# Altium integrated library Rosenberger FAKRA.IntLib: 102 symbols
Pins are listed as number, name and electrical type; pins without a type are passive.

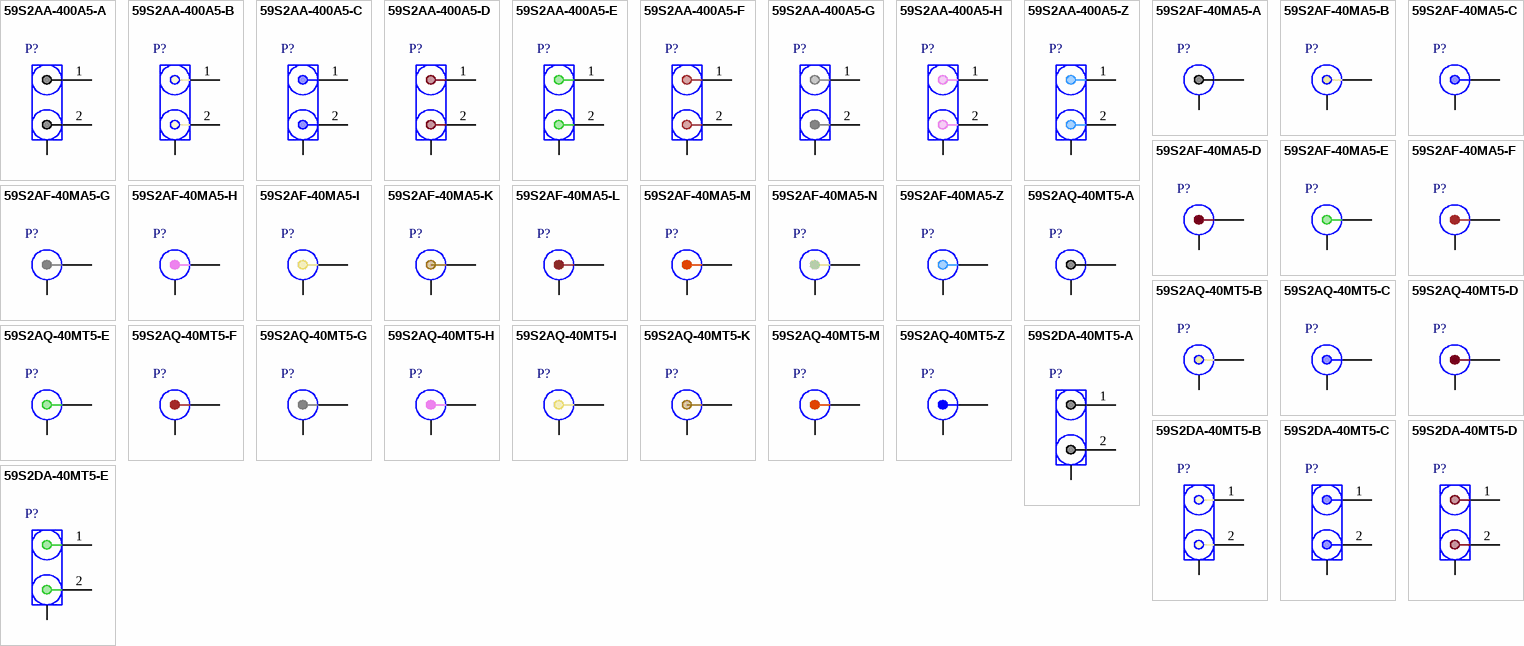
[diagram p0: symbols 59S2AA-400A5-A to 59S2DA-40MT5-E]

## 59S2AA-400A5-A
designator P?
Dual FaKrA Right Angle Plug, Edge Mount, Coding A (Black), Up to 6 GHz, -40 to 105 degC; PartNumber: 59S2AA-400A5-A; Design Note: Footprint in library is a generic example - only application specific footprint delivers High Performance; DatasheetVersion: i00; PackageVersion: i00; PackageReference: 59S2AA-400A5-A; PackageDescription: Dual FaKrA Right Angle Plug, Edge Mount, 21.1 x 17 x 8.35 mm; Coding: A (Black); Mounting Technology: Through Hole; ComponentLink1Description: Manufacturer URL; ComponentLink1URL: http://www.rosenberger.de; ComponentLink2Description: Datasheet; ComponentLink2URL: http://rosenberger.de/ok/images/documents/db/59S2AA-400A5-Y.pdf; ComponentLink3Description: Package Specification; ComponentLink3URL: http://rosenberger.de/ok/images/documents/db/59S2AA-400A5-Y.pdf; ComponentLink4Description: Series Overview / Design Note; ComponentLink4URL: http://rosenberger.de/ok/images/documents/spez/59fakra.pdf; ComponentLink5Description: Webshop / RFQ; ComponentLink5URL: http://www.rosenberger.com/en/contact/sales/
footprint ROS-59S2AA-400A5-A_V (Dual FaKrA Right Angle Plug, Edge Mount, 21.1x17x8.35mm, Rosenberger Recommended)
pins: 1, 2, MH

## 59S2AA-400A5-B
designator P?
Dual FaKrA Right Angle Plug, Edge Mount, Coding B (White), Up to 6 GHz, -40 to 105 degC; PartNumber: 59S2AA-400A5-B; Design Note: Footprint in library is a generic example - only application specific footprint delivers High Performance; DatasheetVersion: i00; PackageVersion: i00; PackageReference: 59S2AA-400A5-B; PackageDescription: Dual FaKrA Right Angle Plug, Edge Mount, 21.1 x 17 x 8.35 mm; Coding: B (White); Mounting Technology: Through Hole; ComponentLink1Description: Manufacturer URL; ComponentLink1URL: http://www.rosenberger.de; ComponentLink2Description: Datasheet; ComponentLink2URL: http://rosenberger.de/ok/images/documents/db/59S2AA-400A5-Y.pdf; ComponentLink3Description: Package Specification; ComponentLink3URL: http://rosenberger.de/ok/images/documents/db/59S2AA-400A5-Y.pdf; ComponentLink4Description: Series Overview / Design Note; ComponentLink4URL: http://rosenberger.de/ok/images/documents/spez/59fakra.pdf; ComponentLink5Description: Webshop / RFQ; ComponentLink5URL: http://www.rosenberger.com/en/contact/sales/
footprint ROS-59S2AA-400A5-B_V (Dual FaKrA Right Angle Plug, Edge Mount, 21.1x17x8.35mm, Rosenberger Recommended)
pins: 1, 2, MH

## 59S2AA-400A5-C
designator P?
Dual FaKrA Right Angle Plug, Edge Mount, Coding C (Blue), Up to 6 GHz, -40 to 105 degC; PartNumber: 59S2AA-400A5-C; Design Note: Footprint in library is a generic example - only application specific footprint delivers High Performance; DatasheetVersion: i00; PackageVersion: i00; PackageReference: 59S2AA-400A5-C; PackageDescription: Dual FaKrA Right Angle Plug, Edge Mount, 21.1 x 17 x 8.35 mm; Coding: C (Blue); Mounting Technology: Through Hole; ComponentLink1Description: Manufacturer URL; ComponentLink1URL: http://www.rosenberger.de; ComponentLink2Description: Datasheet; ComponentLink2URL: http://rosenberger.de/ok/images/documents/db/59S2AA-400A5-Y.pdf; ComponentLink3Description: Package Specification; ComponentLink3URL: http://rosenberger.de/ok/images/documents/db/59S2AA-400A5-Y.pdf; ComponentLink4Description: Series Overview / Design Note; ComponentLink4URL: http://rosenberger.de/ok/images/documents/spez/59fakra.pdf; ComponentLink5Description: Webshop / RFQ; ComponentLink5URL: http://www.rosenberger.com/en/contact/sales/
footprint ROS-59S2AA-400A5-C_V (Dual FaKrA Right Angle Plug, Edge Mount, 21.1x17x8.35mm, Rosenberger Recommended)
pins: 1, 2, MH

## 59S2AA-400A5-D
designator P?
Dual FaKrA Right Angle Plug, Edge Mount, Coding D (Bordeauxviolet), Up to 6 GHz, -40 to 105 degC; PartNumber: 59S2AA-400A5-D; Design Note: Footprint in library is a generic example - only application specific footprint delivers High Performance; DatasheetVersion: i00; PackageVersion: i00; PackageReference: 59S2AA-400A5-D; PackageDescription: Dual FaKrA Right Angle Plug, Edge Mount, 21.1 x 17 x 8.35 mm; Coding: D (Bordeauxviolet); Mounting Technology: Through Hole; ComponentLink1Description: Manufacturer URL; ComponentLink1URL: http://www.rosenberger.de; ComponentLink2Description: Datasheet; ComponentLink2URL: http://rosenberger.de/ok/images/documents/db/59S2AA-400A5-Y.pdf; ComponentLink3Description: Package Specification; ComponentLink3URL: http://rosenberger.de/ok/images/documents/db/59S2AA-400A5-Y.pdf; ComponentLink4Description: Series Overview / Design Note; ComponentLink4URL: http://rosenberger.de/ok/images/documents/spez/59fakra.pdf; ComponentLink5Description: Webshop / RFQ; ComponentLink5URL: http://www.rosenberger.com/en/contact/sales/
footprint ROS-59S2AA-400A5-D_V (Dual FaKrA Right Angle Plug, Edge Mount, 21.1x17x8.35mm, Rosenberger Recommended)
pins: 1, 2, MH

## 59S2AA-400A5-E
designator P?
Dual FaKrA Right Angle Plug, Edge Mount, Coding E (Green), Up to 6 GHz, -40 to 105 degC; PartNumber: 59S2AA-400A5-E; Design Note: Footprint in library is a generic example - only application specific footprint delivers High Performance; DatasheetVersion: i00; PackageVersion: i00; PackageReference: 59S2AA-400A5-E; PackageDescription: Dual FaKrA Right Angle Plug, Edge Mount, 21.1 x 17 x 8.35 mm; Coding: E (Green); Mounting Technology: Through Hole; ComponentLink1Description: Manufacturer URL; ComponentLink1URL: http://www.rosenberger.de; ComponentLink2Description: Datasheet; ComponentLink2URL: http://rosenberger.de/ok/images/documents/db/59S2AA-400A5-Y.pdf; ComponentLink3Description: Package Specification; ComponentLink3URL: http://rosenberger.de/ok/images/documents/db/59S2AA-400A5-Y.pdf; ComponentLink4Description: Series Overview / Design Note; ComponentLink4URL: http://rosenberger.de/ok/images/documents/spez/59fakra.pdf; ComponentLink5Description: Webshop / RFQ; ComponentLink5URL: http://www.rosenberger.com/en/contact/sales/
footprint ROS-59S2AA-400A5-E_V (Dual FaKrA Right Angle Plug, Edge Mount, 21.1x17x8.35mm, Rosenberger Recommended)
pins: 1, 2, MH

## 59S2AA-400A5-F
designator P?
Dual FaKrA Right Angle Plug, Edge Mount, Coding F (Brown), Up to 6 GHz, -40 to 105 degC; PartNumber: 59S2AA-400A5-F; Design Note: Footprint in library is a generic example - only application specific footprint delivers High Performance; DatasheetVersion: i00; PackageVersion: i00; PackageReference: 59S2AA-400A5-F; PackageDescription: Dual FaKrA Right Angle Plug, Edge Mount, 21.1 x 17 x 8.35 mm; Coding: F (Brown); Mounting Technology: Through Hole; ComponentLink1Description: Manufacturer URL; ComponentLink1URL: http://www.rosenberger.de; ComponentLink2Description: Datasheet; ComponentLink2URL: http://rosenberger.de/ok/images/documents/db/59S2AA-400A5-Y.pdf; ComponentLink3Description: Package Specification; ComponentLink3URL: http://rosenberger.de/ok/images/documents/db/59S2AA-400A5-Y.pdf; ComponentLink4Description: Series Overview / Design Note; ComponentLink4URL: http://rosenberger.de/ok/images/documents/spez/59fakra.pdf; ComponentLink5Description: Webshop / RFQ; ComponentLink5URL: http://www.rosenberger.com/en/contact/sales/
footprint ROS-59S2AA-400A5-F_V (Dual FaKrA Right Angle Plug, Edge Mount, 21.1x17x8.35mm, Rosenberger Recommended)
pins: 1, 2, MH

## 59S2AA-400A5-G
designator P?
Dual FaKrA Right Angle Plug, Edge Mount, Coding G (Grey), Up to 6 GHz, -40 to 105 degC; PartNumber: 59S2AA-400A5-G; Design Note: Footprint in library is a generic example - only application specific footprint delivers High Performance; DatasheetVersion: i00; PackageVersion: i00; PackageReference: 59S2AA-400A5-G; PackageDescription: Dual FaKrA Right Angle Plug, Edge Mount, 21.1 x 17 x 8.35 mm; Coding: G (Grey); Mounting Technology: Through Hole; ComponentLink1Description: Manufacturer URL; ComponentLink1URL: http://www.rosenberger.de; ComponentLink2Description: Datasheet; ComponentLink2URL: http://rosenberger.de/ok/images/documents/db/59S2AA-400A5-Y.pdf; ComponentLink3Description: Package Specification; ComponentLink3URL: http://rosenberger.de/ok/images/documents/db/59S2AA-400A5-Y.pdf; ComponentLink4Description: Series Overview / Design Note; ComponentLink4URL: http://rosenberger.de/ok/images/documents/spez/59fakra.pdf; ComponentLink5Description: Webshop / RFQ; ComponentLink5URL: http://www.rosenberger.com/en/contact/sales/
footprint ROS-59S2AA-400A5-G_V (Dual FaKrA Right Angle Plug, Edge Mount, 21.1x17x8.35mm, Rosenberger Recommended)
pins: 1, 2, MH

## 59S2AA-400A5-H
designator P?
Dual FaKrA Right Angle Plug, Edge Mount, Coding H (Violet), Up to 6 GHz, -40 to 105 degC; PartNumber: 59S2AA-400A5-H; Design Note: Footprint in library is a generic example - only application specific footprint delivers High Performance; DatasheetVersion: i00; PackageVersion: i00; PackageReference: 59S2AA-400A5-H; PackageDescription: Dual FaKrA Right Angle Plug, Edge Mount, 21.1 x 17 x 8.35 mm; Coding: H (Violet); Mounting Technology: Through Hole; ComponentLink1Description: Manufacturer URL; ComponentLink1URL: http://www.rosenberger.de; ComponentLink2Description: Datasheet; ComponentLink2URL: http://rosenberger.de/ok/images/documents/db/59S2AA-400A5-Y.pdf; ComponentLink3Description: Package Specification; ComponentLink3URL: http://rosenberger.de/ok/images/documents/db/59S2AA-400A5-Y.pdf; ComponentLink4Description: Series Overview / Design Note; ComponentLink4URL: http://rosenberger.de/ok/images/documents/spez/59fakra.pdf; ComponentLink5Description: Webshop / RFQ; ComponentLink5URL: http://www.rosenberger.com/en/contact/sales/
footprint ROS-59S2AA-400A5-H_V (Dual FaKrA Right Angle Plug, Edge Mount, 21.1x17x8.35mm, Rosenberger Recommended)
pins: 1, 2, MH

## 59S2AA-400A5-Z
designator P?
Dual FaKrA Right Angle Plug, Edge Mount, Coding Z (Waterblue), Up to 6 GHz, -40 to 105 degC; PartNumber: 59S2AA-400A5-Z; Design Note: Footprint in library is a generic example - only application specific footprint delivers High Performance; DatasheetVersion: i00; PackageVersion: i00; PackageReference: 59S2AA-400A5-Z; PackageDescription: Dual FaKrA Right Angle Plug, Edge Mount, 21.1 x 17 x 8.35 mm; Coding: Z (Waterblue); Mounting Technology: Through Hole; ComponentLink1Description: Manufacturer URL; ComponentLink1URL: http://www.rosenberger.de; ComponentLink2Description: Datasheet; ComponentLink2URL: http://rosenberger.de/ok/images/documents/db/59S2AA-400A5-Y.pdf; ComponentLink3Description: Package Specification; ComponentLink3URL: http://rosenberger.de/ok/images/documents/db/59S2AA-400A5-Y.pdf; ComponentLink4Description: Series Overview / Design Note; ComponentLink4URL: http://rosenberger.de/ok/images/documents/spez/59fakra.pdf; ComponentLink5Description: Webshop / RFQ; ComponentLink5URL: http://www.rosenberger.com/en/contact/sales/
footprint ROS-59S2AA-400A5-Z_V (Dual FaKrA Right Angle Plug, Edge Mount, 21.1x17x8.35mm, Rosenberger Recommended)
pins: 1, 2, MH

## 59S2AF-40MA5-A
designator P?
FaKrA Right Angle Plug, Edge Mount Pin in Paste, Coding A (Black), Up to 6 GHz, -40 to 105 degC; PartNumber: 59S2AF-40MA5-A; Design Note: Footprint in library is a generic example - only application specific footprint delivers High Performance; DatasheetVersion: b00; PackageVersion: b00; PackageReference: 59S2AF-40MA5-A; PackageDescription: FaKra-HF Right Angle Plug, Edge Mount Pin in Paste, 23.1 x 9.3 x 5.45 mm; Coding: A (Black); Mounting Technology: Pin-in-Paste; ComponentLink1Description: Manufacturer URL; ComponentLink1URL: http://www.rosenberger.de; ComponentLink2Description: Datasheet; ComponentLink2URL: http://rosenberger.de/ok/images/documents/db/59S2AF-40MA5-Y.pdf; ComponentLink3Description: Package Specification; ComponentLink3URL: http://rosenberger.de/ok/images/documents/db/59S2AF-40MA5-Y.pdf; ComponentLink4Description: Series Overview / Design Note; ComponentLink4URL: http://rosenberger.de/ok/images/documents/spez/59fakra.pdf; ComponentLink5Description: Webshop / RFQ; ComponentLink5URL: http://www.rosenberger.com/en/contact/sales/
footprint ROS-59S2AF-40MA5-A_V (FaKra-HF Right Angle Plug, Edge Mount Pin in Paste, 23.1x9.3x5.45mm, Rosenberger Recommended)
pins: 1, MH

## 59S2AF-40MA5-B
designator P?
FaKrA Right Angle Plug, Edge Mount Pin in Paste, Coding B (White), Up to 6 GHz, -40 to 105 degC; PartNumber: 59S2AF-40MA5-B; Design Note: Footprint in library is a generic example - only application specific footprint delivers High Performance; DatasheetVersion: b00; PackageVersion: b00; PackageReference: 59S2AF-40MA5-B; PackageDescription: FaKra-HF Right Angle Plug, Edge Mount Pin in Paste, 23.1 x 9.3 x 5.45 mm; Coding: B (White); Mounting Technology: Pin-in-Paste; ComponentLink1Description: Manufacturer URL; ComponentLink1URL: http://www.rosenberger.de; ComponentLink2Description: Datasheet; ComponentLink2URL: http://rosenberger.de/ok/images/documents/db/59S2AF-40MA5-Y.pdf; ComponentLink3Description: Package Specification; ComponentLink3URL: http://rosenberger.de/ok/images/documents/db/59S2AF-40MA5-Y.pdf; ComponentLink4Description: Series Overview / Design Note; ComponentLink4URL: http://rosenberger.de/ok/images/documents/spez/59fakra.pdf; ComponentLink5Description: Webshop / RFQ; ComponentLink5URL: http://www.rosenberger.com/en/contact/sales/
footprint ROS-59S2AF-40MA5-B_V (FaKra-HF Right Angle Plug, Edge Mount Pin in Paste, 23.1x9.3x5.45mm, Rosenberger Recommended)
pins: 1, MH

## 59S2AF-40MA5-C
designator P?
FaKrA Right Angle Plug, Edge Mount Pin in Paste, Coding C (Blue), Up to 6 GHz, -40 to 105 degC; PartNumber: 59S2AF-40MA5-C; Design Note: Footprint in library is a generic example - only application specific footprint delivers High Performance; DatasheetVersion: b00; PackageVersion: b00; PackageReference: 59S2AF-40MA5-C; PackageDescription: FaKra-HF Right Angle Plug, Edge Mount Pin in Paste, 23.1 x 9.3 x 5.45 mm; Coding: C (Blue); Mounting Technology: Pin-in-Paste; ComponentLink1Description: Manufacturer URL; ComponentLink1URL: http://www.rosenberger.de; ComponentLink2Description: Datasheet; ComponentLink2URL: http://rosenberger.de/ok/images/documents/db/59S2AF-40MA5-Y.pdf; ComponentLink3Description: Package Specification; ComponentLink3URL: http://rosenberger.de/ok/images/documents/db/59S2AF-40MA5-Y.pdf; ComponentLink4Description: Series Overview / Design Note; ComponentLink4URL: http://rosenberger.de/ok/images/documents/spez/59fakra.pdf; ComponentLink5Description: Webshop / RFQ; ComponentLink5URL: http://www.rosenberger.com/en/contact/sales/
footprint ROS-59S2AF-40MA5-C_V (FaKra-HF Right Angle Plug, Edge Mount Pin in Paste, 23.1x9.3x5.45mm, Rosenberger Recommended)
pins: 1, MH

## 59S2AF-40MA5-D
designator P?
FaKrA Right Angle Plug, Edge Mount Pin in Paste, Coding D (Bordeauxviolet), Up to 6 GHz, -40 to 105 degC; PartNumber: 59S2AF-40MA5-D; Design Note: Footprint in library is a generic example - only application specific footprint delivers High Performance; DatasheetVersion: b00; PackageVersion: b00; PackageReference: 59S2AF-40MA5-D; PackageDescription: FaKra-HF Right Angle Plug, Edge Mount Pin in Paste, 23.1 x 9.3 x 5.45 mm; Coding: D (Bordeauxviolet); Mounting Technology: Pin-in-Paste; ComponentLink1Description: Manufacturer URL; ComponentLink1URL: http://www.rosenberger.de; ComponentLink2Description: Datasheet; ComponentLink2URL: http://rosenberger.de/ok/images/documents/db/59S2AF-40MA5-Y.pdf; ComponentLink3Description: Package Specification; ComponentLink3URL: http://rosenberger.de/ok/images/documents/db/59S2AF-40MA5-Y.pdf; ComponentLink4Description: Series Overview / Design Note; ComponentLink4URL: http://rosenberger.de/ok/images/documents/spez/59fakra.pdf; ComponentLink5Description: Webshop / RFQ; ComponentLink5URL: http://www.rosenberger.com/en/contact/sales/
footprint ROS-59S2AF-40MA5-D_V (FaKra-HF Right Angle Plug, Edge Mount Pin in Paste, 23.1x9.3x5.45mm, Rosenberger Recommended)
pins: 1, MH

## 59S2AF-40MA5-E
designator P?
FaKrA Right Angle Plug, Edge Mount Pin in Paste, Coding E (Green), Up to 6 GHz, -40 to 105 degC; PartNumber: 59S2AF-40MA5-E; Design Note: Footprint in library is a generic example - only application specific footprint delivers High Performance; DatasheetVersion: b00; PackageVersion: b00; PackageReference: 59S2AF-40MA5-E; PackageDescription: FaKra-HF Right Angle Plug, Edge Mount Pin in Paste, 23.1 x 9.3 x 5.45 mm; Coding: E (Green); Mounting Technology: Pin-in-Paste; ComponentLink1Description: Manufacturer URL; ComponentLink1URL: http://www.rosenberger.de; ComponentLink2Description: Datasheet; ComponentLink2URL: http://rosenberger.de/ok/images/documents/db/59S2AF-40MA5-Y.pdf; ComponentLink3Description: Package Specification; ComponentLink3URL: http://rosenberger.de/ok/images/documents/db/59S2AF-40MA5-Y.pdf; ComponentLink4Description: Series Overview / Design Note; ComponentLink4URL: http://rosenberger.de/ok/images/documents/spez/59fakra.pdf; ComponentLink5Description: Webshop / RFQ; ComponentLink5URL: http://www.rosenberger.com/en/contact/sales/
footprint ROS-59S2AF-40MA5-E_V (FaKra-HF Right Angle Plug, Edge Mount Pin in Paste, 23.1x9.3x5.45mm, Rosenberger Recommended)
pins: 1, MH

## 59S2AF-40MA5-F
designator P?
FaKrA Right Angle Plug, Edge Mount Pin in Paste, Coding F (Brown), Up to 6 GHz, -40 to 105 degC; PartNumber: 59S2AF-40MA5-F; Design Note: Footprint in library is a generic example - only application specific footprint delivers High Performance; DatasheetVersion: b00; PackageVersion: b00; PackageReference: 59S2AF-40MA5-F; PackageDescription: FaKra-HF Right Angle Plug, Edge Mount Pin in Paste, 23.1 x 9.3 x 5.45 mm; Coding: F (Brown); Mounting Technology: Pin-in-Paste; ComponentLink1Description: Manufacturer URL; ComponentLink1URL: http://www.rosenberger.de; ComponentLink2Description: Datasheet; ComponentLink2URL: http://rosenberger.de/ok/images/documents/db/59S2AF-40MA5-Y.pdf; ComponentLink3Description: Package Specification; ComponentLink3URL: http://rosenberger.de/ok/images/documents/db/59S2AF-40MA5-Y.pdf; ComponentLink4Description: Series Overview / Design Note; ComponentLink4URL: http://rosenberger.de/ok/images/documents/spez/59fakra.pdf; ComponentLink5Description: Webshop / RFQ; ComponentLink5URL: http://www.rosenberger.com/en/contact/sales/
footprint ROS-59S2AF-40MA5-F_V (FaKra-HF Right Angle Plug, Edge Mount Pin in Paste, 23.1x9.3x5.45mm, Rosenberger Recommended)
pins: 1, MH

## 59S2AF-40MA5-G
designator P?
FaKrA Right Angle Plug, Edge Mount Pin in Paste, Coding G (Grey), Up to 6 GHz, -40 to 105 degC; PartNumber: 59S2AF-40MA5-G; Design Note: Footprint in library is a generic example - only application specific footprint delivers High Performance; DatasheetVersion: b00; PackageVersion: b00; PackageReference: 59S2AF-40MA5-G; PackageDescription: FaKra-HF Right Angle Plug, Edge Mount Pin in Paste, 23.1 x 9.3 x 5.45 mm; Coding: G (Grey); Mounting Technology: Pin-in-Paste; ComponentLink1Description: Manufacturer URL; ComponentLink1URL: http://www.rosenberger.de; ComponentLink2Description: Datasheet; ComponentLink2URL: http://rosenberger.de/ok/images/documents/db/59S2AF-40MA5-Y.pdf; ComponentLink3Description: Package Specification; ComponentLink3URL: http://rosenberger.de/ok/images/documents/db/59S2AF-40MA5-Y.pdf; ComponentLink4Description: Series Overview / Design Note; ComponentLink4URL: http://rosenberger.de/ok/images/documents/spez/59fakra.pdf; ComponentLink5Description: Webshop / RFQ; ComponentLink5URL: http://www.rosenberger.com/en/contact/sales/
footprint ROS-59S2AF-40MA5-G_V (FaKra-HF Right Angle Plug, Edge Mount Pin in Paste, 23.1x9.3x5.45mm, Rosenberger Recommended)
pins: 1, MH

## 59S2AF-40MA5-H
designator P?
FaKrA Right Angle Plug, Edge Mount Pin in Paste, Coding H (Violet), Up to 6 GHz, -40 to 105 degC; PartNumber: 59S2AF-40MA5-H; Design Note: Footprint in library is a generic example - only application specific footprint delivers High Performance; DatasheetVersion: b00; PackageVersion: b00; PackageReference: 59S2AF-40MA5-H; PackageDescription: FaKra-HF Right Angle Plug, Edge Mount Pin in Paste, 23.1 x 9.3 x 5.45 mm; Coding: H (Violet); Mounting Technology: Pin-in-Paste; ComponentLink1Description: Manufacturer URL; ComponentLink1URL: http://www.rosenberger.de; ComponentLink2Description: Datasheet; ComponentLink2URL: http://rosenberger.de/ok/images/documents/db/59S2AF-40MA5-Y.pdf; ComponentLink3Description: Package Specification; ComponentLink3URL: http://rosenberger.de/ok/images/documents/db/59S2AF-40MA5-Y.pdf; ComponentLink4Description: Series Overview / Design Note; ComponentLink4URL: http://rosenberger.de/ok/images/documents/spez/59fakra.pdf; ComponentLink5Description: Webshop / RFQ; ComponentLink5URL: http://www.rosenberger.com/en/contact/sales/
footprint ROS-59S2AF-40MA5-H_V (FaKra-HF Right Angle Plug, Edge Mount Pin in Paste, 23.1x9.3x5.45mm, Rosenberger Recommended)
pins: 1, MH

## 59S2AF-40MA5-I
designator P?
FaKrA Right Angle Plug, Edge Mount Pin in Paste, Coding I (Beige), Up to 6 GHz, -40 to 105 degC; PartNumber: 59S2AF-40MA5-I; Design Note: Footprint in library is a generic example - only application specific footprint delivers High Performance; DatasheetVersion: b00; PackageVersion: b00; PackageReference: 59S2AF-40MA5-I; PackageDescription: FaKra-HF Right Angle Plug, Edge Mount Pin in Paste, 23.1 x 9.3 x 5.45 mm; Coding: I (Beige); Mounting Technology: Pin-in-Paste; ComponentLink1Description: Manufacturer URL; ComponentLink1URL: http://www.rosenberger.de; ComponentLink2Description: Datasheet; ComponentLink2URL: http://rosenberger.de/ok/images/documents/db/59S2AF-40MA5-Y.pdf; ComponentLink3Description: Package Specification; ComponentLink3URL: http://rosenberger.de/ok/images/documents/db/59S2AF-40MA5-Y.pdf; ComponentLink4Description: Series Overview / Design Note; ComponentLink4URL: http://rosenberger.de/ok/images/documents/spez/59fakra.pdf; ComponentLink5Description: Webshop / RFQ; ComponentLink5URL: http://www.rosenberger.com/en/contact/sales/
footprint ROS-59S2AF-40MA5-I_V (FaKra-HF Right Angle Plug, Edge Mount Pin in Paste, 23.1x9.3x5.45mm, Rosenberger Recommended)
pins: 1, MH

## 59S2AF-40MA5-K
designator P?
FaKrA Right Angle Plug, Edge Mount Pin in Paste, Coding K (Curry), Up to 6 GHz, -40 to 105 degC; PartNumber: 59S2AF-40MA5-K; Design Note: Footprint in library is a generic example - only application specific footprint delivers High Performance; DatasheetVersion: b00; PackageVersion: b00; PackageReference: 59S2AF-40MA5-K; PackageDescription: FaKra-HF Right Angle Plug, Edge Mount Pin in Paste, 23.1 x 9.3 x 5.45 mm; Coding: K (Curry); Mounting Technology: Pin-in-Paste; ComponentLink1Description: Manufacturer URL; ComponentLink1URL: http://www.rosenberger.de; ComponentLink2Description: Datasheet; ComponentLink2URL: http://rosenberger.de/ok/images/documents/db/59S2AF-40MA5-Y.pdf; ComponentLink3Description: Package Specification; ComponentLink3URL: http://rosenberger.de/ok/images/documents/db/59S2AF-40MA5-Y.pdf; ComponentLink4Description: Series Overview / Design Note; ComponentLink4URL: http://rosenberger.de/ok/images/documents/spez/59fakra.pdf; ComponentLink5Description: Webshop / RFQ; ComponentLink5URL: http://www.rosenberger.com/en/contact/sales/
footprint ROS-59S2AF-40MA5-K_V (FaKra-HF Right Angle Plug, Edge Mount Pin in Paste, 23.1x9.3x5.45mm, Rosenberger Recommended)
pins: 1, MH

## 59S2AF-40MA5-L
designator P?
FaKrA Right Angle Plug, Edge Mount Pin in Paste, Coding L (Carmine-Red), Up to 6 GHz, -40 to 105 degC; PartNumber: 59S2AF-40MA5-L; Design Note: Footprint in library is a generic example - only application specific footprint delivers High Performance; DatasheetVersion: b00; PackageVersion: b00; PackageReference: 59S2AF-40MA5-L; PackageDescription: FaKra-HF Right Angle Plug, Edge Mount Pin in Paste, 23.1 x 9.3 x 5.45 mm; Coding: L (Carmine-Red); Mounting Technology: Pin-in-Paste; ComponentLink1Description: Manufacturer URL; ComponentLink1URL: http://www.rosenberger.de; ComponentLink2Description: Datasheet; ComponentLink2URL: http://rosenberger.de/ok/images/documents/db/59S2AF-40MA5-Y.pdf; ComponentLink3Description: Package Specification; ComponentLink3URL: http://rosenberger.de/ok/images/documents/db/59S2AF-40MA5-Y.pdf; ComponentLink4Description: Series Overview / Design Note; ComponentLink4URL: http://rosenberger.de/ok/images/documents/spez/59fakra.pdf; ComponentLink5Description: Webshop / RFQ; ComponentLink5URL: http://www.rosenberger.com/en/contact/sales/
footprint ROS-59S2AF-40MA5-L_V (FaKra-HF Right Angle Plug, Edge Mount Pin in Paste, 23.1x9.3x5.45mm, Rosenberger Recommended)
pins: 1, MH

## 59S2AF-40MA5-M
designator P?
FaKrA Right Angle Plug, Edge Mount Pin in Paste, Coding M (Pastel-Orange), Up to 6 GHz, -40 to 105 degC; PartNumber: 59S2AF-40MA5-M; Coding: M (Pastel Orange); Design Note: Footprint in library is a generic example - only application specific footprint delivers High Performance; DatasheetVersion: b00; PackageVersion: b00; PackageReference: 59S2AF-40MA5-M; PackageDescription: FaKra-HF Right Angle Plug, Edge Mount Pin in Paste, 23.1 x 9.3 x 5.45 mm; Mounting Technology: Pin-in-Paste; ComponentLink1Description: Manufacturer URL; ComponentLink1URL: http://www.rosenberger.de; ComponentLink2Description: Datasheet; ComponentLink2URL: http://rosenberger.de/ok/images/documents/db/59S2AF-40MA5-Y.pdf; ComponentLink3Description: Package Specification; ComponentLink3URL: http://rosenberger.de/ok/images/documents/db/59S2AF-40MA5-Y.pdf; ComponentLink4Description: Series Overview / Design Note; ComponentLink4URL: http://rosenberger.de/ok/images/documents/spez/59fakra.pdf; ComponentLink5Description: Webshop / RFQ; ComponentLink5URL: http://www.rosenberger.com/en/contact/sales/
footprint ROS-59S2AF-40MA5-M_V (FaKra-HF Right Angle Plug, Edge Mount Pin in Paste, 23.1x9.3x5.45mm, Rosenberger Recommended)
pins: 1, MH

## 59S2AF-40MA5-N
designator P?
FaKrA Right Angle Plug, Edge Mount Pin in Paste, Coding N (Pastel-Green), Up to 6 GHz, -40 to 105 degC; PartNumber: 59S2AF-40MA5-N; Design Note: Footprint in library is a generic example - only application specific footprint delivers High Performance; DatasheetVersion: b00; PackageVersion: b00; PackageReference: 59S2AF-40MA5-N; PackageDescription: FaKra-HF Right Angle Plug, Edge Mount Pin in Paste, 23.1 x 9.3 x 5.45 mm; Coding: N (Pastel-Green); Mounting Technology: Pin-in-Paste; ComponentLink1Description: Manufacturer URL; ComponentLink1URL: http://www.rosenberger.de; ComponentLink2Description: Datasheet; ComponentLink2URL: http://rosenberger.de/ok/images/documents/db/59S2AF-40MA5-Y.pdf; ComponentLink3Description: Package Specification; ComponentLink3URL: http://rosenberger.de/ok/images/documents/db/59S2AF-40MA5-Y.pdf; ComponentLink4Description: Series Overview / Design Note; ComponentLink4URL: http://rosenberger.de/ok/images/documents/spez/59fakra.pdf; ComponentLink5Description: Webshop / RFQ; ComponentLink5URL: http://www.rosenberger.com/en/contact/sales/
footprint ROS-59S2AF-40MA5-N_V (FaKra-HF Right Angle Plug, Edge Mount Pin in Paste, 23.1x9.3x5.45mm, Rosenberger Recommended)
pins: 1, MH

## 59S2AF-40MA5-Z
designator P?
FaKrA Right Angle Plug, Edge Mount Pin in Paste, Upside Down, Coding Z (Waterblue), Up to 6 GHz, -40 to 105 degC; PartNumber: 59S2AF-40MA5-Z; Design Note: Footprint in library is a generic example - only application specific footprint delivers High Performance; DatasheetVersion: b00; PackageVersion: b00; PackageReference: 59S2AF-40MA5-Z; PackageDescription: FaKra-HF Right Angle Plug, Edge Mount Pin in Paste, 23.1 x 9.3 x 5.45 mm; Coding: Z (Waterblue); Mounting Technology: Pin-in-Paste; ComponentLink1Description: Manufacturer URL; ComponentLink1URL: http://www.rosenberger.de; ComponentLink2Description: Datasheet; ComponentLink2URL: http://rosenberger.de/ok/images/documents/db/59S2AF-40MA5-Y.pdf; ComponentLink3Description: Package Specification; ComponentLink3URL: http://rosenberger.de/ok/images/documents/db/59S2AF-40MA5-Y.pdf; ComponentLink4Description: Series Overview / Design Note; ComponentLink4URL: http://rosenberger.de/ok/images/documents/spez/59fakra.pdf; ComponentLink5Description: Webshop / RFQ; ComponentLink5URL: http://www.rosenberger.com/en/contact/sales/
footprint ROS-59S2AF-40MA5-Z_V (FaKra-HF Right Angle Plug, Edge Mount Pin in Paste, 23.1x9.3x5.45mm, Rosenberger Recommended)
pins: 1, MH

## 59S2AQ-40MT5-A
designator P?
FaKrA Right Angle Plug, Edge Mount Pin in Paste, Coding A (Black), In Line, Up to 6 GHz, -40 to 105 degC; PartNumber: 59S2AQ-40MT5-A; Design Note: Footprint in library is a generic example - only application specific footprint delivers High Performance; DatasheetVersion: c00; PackageVersion: c00; PackageReference: 59S2AQ-40MT5-A; PackageDescription: FaKrA Right Angle Plug, Pin in Paste, 22.65 x 8.5 x 3.8 mm; Coding: A (Black); Mounting Technology: Pin-in-Paste; ComponentLink1Description: Manufacturer URL; ComponentLink1URL: http://www.rosenberger.de; ComponentLink2Description: Datasheet; ComponentLink2URL: http://rosenberger.de/ok/images/documents/db/59S2AQ-40MT5-Y.pdf; ComponentLink3Description: Package Specification; ComponentLink3URL: http://rosenberger.de/ok/images/documents/db/59S2AQ-40MT5-Y.pdf; ComponentLink4Description: Series Overview / Design Note; ComponentLink4URL: http://rosenberger.de/ok/images/documents/spez/59fakra.pdf; ComponentLink5Description: Webshop / RFQ; ComponentLink5URL: http://www.rosenberger.com/en/contact/sales/
footprint ROS-59S2AQ-40MT5-A_V (FaKrA Right Angle Plug, Pin in Paste, 22.65x8.5x3.8mm, Rosenberger Recommended)
pins: 1, MH

## 59S2AQ-40MT5-B
designator P?
FaKrA Right Angle Plug, Edge Mount Pin in Paste, Coding B (White), In Line, Up to 6 GHz, -40 to 105 degC; PartNumber: 59S2AQ-40MT5-B; Design Note: Footprint in library is a generic example - only application specific footprint delivers High Performance; DatasheetVersion: c00; PackageVersion: c00; PackageReference: 59S2AQ-40MT5-B; PackageDescription: FaKrA Right Angle Plug, Pin in Paste, 22.65 x 8.5 x 3.8 mm; Coding: B (White); Mounting Technology: Pin-in-Paste; ComponentLink1Description: Manufacturer URL; ComponentLink1URL: http://www.rosenberger.de; ComponentLink2Description: Datasheet; ComponentLink2URL: http://rosenberger.de/ok/images/documents/db/59S2AQ-40MT5-Y.pdf; ComponentLink3Description: Package Specification; ComponentLink3URL: http://rosenberger.de/ok/images/documents/db/59S2AQ-40MT5-Y.pdf; ComponentLink4Description: Series Overview / Design Note; ComponentLink4URL: http://rosenberger.de/ok/images/documents/spez/59fakra.pdf; ComponentLink5Description: Webshop / RFQ; ComponentLink5URL: http://www.rosenberger.com/en/contact/sales/
footprint ROS-59S2AQ-40MT5-B_V (FaKrA Right Angle Plug, Pin in Paste, 22.65x8.5x3.8mm, Rosenberger Recommended)
pins: 1, MH

## 59S2AQ-40MT5-C
designator P?
FaKrA Right Angle Plug, Edge Mount Pin in Paste, Coding C (Blue), In Line, Up to 6 GHz, -40 to 105 degC; PartNumber: 59S2AQ-40MT5-C; Design Note: Footprint in library is a generic example - only application specific footprint delivers High Performance; DatasheetVersion: c00; PackageVersion: c00; PackageReference: 59S2AQ-40MT5-C; PackageDescription: FaKrA Right Angle Plug, Pin in Paste, 22.65 x 8.5 x 3.8 mm; Coding: C (Blue); Mounting Technology: Pin-in-Paste; ComponentLink1Description: Manufacturer URL; ComponentLink1URL: http://www.rosenberger.de; ComponentLink2Description: Datasheet; ComponentLink2URL: http://rosenberger.de/ok/images/documents/db/59S2AQ-40MT5-Y.pdf; ComponentLink3Description: Package Specification; ComponentLink3URL: http://rosenberger.de/ok/images/documents/db/59S2AQ-40MT5-Y.pdf; ComponentLink4Description: Series Overview / Design Note; ComponentLink4URL: http://rosenberger.de/ok/images/documents/spez/59fakra.pdf; ComponentLink5Description: Webshop / RFQ; ComponentLink5URL: http://www.rosenberger.com/en/contact/sales/
footprint ROS-59S2AQ-40MT5-C_V (FaKrA Right Angle Plug, Pin in Paste, 22.65x8.5x3.8mm, Rosenberger Recommended)
pins: 1, MH

## 59S2AQ-40MT5-D
designator P?
FaKrA Right Angle Plug, Edge Mount Pin in Paste, Coding D (Bordeauxviolet), In Line, Up to 6 GHz, -40 to 105 degC; PartNumber: 59S2AQ-40MT5-D; Design Note: Footprint in library is a generic example - only application specific footprint delivers High Performance; DatasheetVersion: c00; PackageVersion: c00; PackageReference: 59S2AQ-40MT5-D; PackageDescription: FaKrA Right Angle Plug, Pin in Paste, 22.65 x 8.5 x 3.8 mm; Coding: D (Bordeauxviolet); Mounting Technology: Pin-in-Paste; ComponentLink1Description: Manufacturer URL; ComponentLink1URL: http://www.rosenberger.de; ComponentLink2Description: Datasheet; ComponentLink2URL: http://rosenberger.de/ok/images/documents/db/59S2AQ-40MT5-Y.pdf; ComponentLink3Description: Package Specification; ComponentLink3URL: http://rosenberger.de/ok/images/documents/db/59S2AQ-40MT5-Y.pdf; ComponentLink4Description: Series Overview / Design Note; ComponentLink4URL: http://rosenberger.de/ok/images/documents/spez/59fakra.pdf; ComponentLink5Description: Webshop / RFQ; ComponentLink5URL: http://www.rosenberger.com/en/contact/sales/
footprint ROS-59S2AQ-40MT5-D_V (FaKrA Right Angle Plug, Pin in Paste, 22.65x8.5x3.8mm, Rosenberger Recommended)
pins: 1, MH

## 59S2AQ-40MT5-E
designator P?
FaKrA Right Angle Plug, Edge Mount Pin in Paste, Coding E (Green), In Line, Up to 6 GHz, -40 to 105 degC; PartNumber: 59S2AQ-40MT5-E; Design Note: Footprint in library is a generic example - only application specific footprint delivers High Performance; DatasheetVersion: c00; PackageVersion: c00; PackageReference: 59S2AQ-40MT5-E; PackageDescription: FaKrA Right Angle Plug, Pin in Paste, 22.65 x 8.5 x 3.8 mm; Coding: E (Green); Mounting Technology: Pin-in-Paste; ComponentLink1Description: Manufacturer URL; ComponentLink1URL: http://www.rosenberger.de; ComponentLink2Description: Datasheet; ComponentLink2URL: http://rosenberger.de/ok/images/documents/db/59S2AQ-40MT5-Y.pdf; ComponentLink3Description: Package Specification; ComponentLink3URL: http://rosenberger.de/ok/images/documents/db/59S2AQ-40MT5-Y.pdf; ComponentLink4Description: Series Overview / Design Note; ComponentLink4URL: http://rosenberger.de/ok/images/documents/spez/59fakra.pdf; ComponentLink5Description: Webshop / RFQ; ComponentLink5URL: http://www.rosenberger.com/en/contact/sales/
footprint ROS-59S2AQ-40MT5-E_V (FaKrA Right Angle Plug, Pin in Paste, 22.65x8.5x3.8mm, Rosenberger Recommended)
pins: 1, MH

## 59S2AQ-40MT5-F
designator P?
FaKrA Right Angle Plug, Edge Mount Pin in Paste, Coding F (Brown), In Line, Up to 6 GHz, -40 to 105 degC; PartNumber: 59S2AQ-40MT5-F; Design Note: Footprint in library is a generic example - only application specific footprint delivers High Performance; DatasheetVersion: c00; PackageVersion: c00; PackageReference: 59S2AQ-40MT5-F; PackageDescription: FaKrA Right Angle Plug, Pin in Paste, 22.65 x 8.5 x 3.8 mm; Coding: F (Brown); Mounting Technology: Pin-in-Paste; ComponentLink1Description: Manufacturer URL; ComponentLink1URL: http://www.rosenberger.de; ComponentLink2Description: Datasheet; ComponentLink2URL: http://rosenberger.de/ok/images/documents/db/59S2AQ-40MT5-Y.pdf; ComponentLink3Description: Package Specification; ComponentLink3URL: http://rosenberger.de/ok/images/documents/db/59S2AQ-40MT5-Y.pdf; ComponentLink4Description: Series Overview / Design Note; ComponentLink4URL: http://rosenberger.de/ok/images/documents/spez/59fakra.pdf; ComponentLink5Description: Webshop / RFQ; ComponentLink5URL: http://www.rosenberger.com/en/contact/sales/
footprint ROS-59S2AQ-40MT5-F_V (FaKrA Right Angle Plug, Pin in Paste, 22.65x8.5x3.8mm, Rosenberger Recommended)
pins: 1, MH

## 59S2AQ-40MT5-G
designator P?
FaKrA Right Angle Plug, Edge Mount Pin in Paste, Coding G (Grey), In Line, Up to 6 GHz, -40 to 105 degC; PartNumber: 59S2AQ-40MT5-G; Design Note: Footprint in library is a generic example - only application specific footprint delivers High Performance; DatasheetVersion: c00; PackageVersion: c00; PackageReference: 59S2AQ-40MT5-G; PackageDescription: FaKrA Right Angle Plug, Pin in Paste, 22.65 x 8.5 x 3.8 mm; Coding: G (Grey); Mounting Technology: Pin-in-Paste; ComponentLink1Description: Manufacturer URL; ComponentLink1URL: http://www.rosenberger.de; ComponentLink2Description: Datasheet; ComponentLink2URL: http://rosenberger.de/ok/images/documents/db/59S2AQ-40MT5-Y.pdf; ComponentLink3Description: Package Specification; ComponentLink3URL: http://rosenberger.de/ok/images/documents/db/59S2AQ-40MT5-Y.pdf; ComponentLink4Description: Series Overview / Design Note; ComponentLink4URL: http://rosenberger.de/ok/images/documents/spez/59fakra.pdf; ComponentLink5Description: Webshop / RFQ; ComponentLink5URL: http://www.rosenberger.com/en/contact/sales/
footprint ROS-59S2AQ-40MT5-G_V (FaKrA Right Angle Plug, Pin in Paste, 22.65x8.5x3.8mm, Rosenberger Recommended)
pins: 1, MH

## 59S2AQ-40MT5-H
designator P?
FaKrA Right Angle Plug, Edge Mount Pin in Paste, Coding H (Violet), In Line, Up to 6 GHz, -40 to 105 degC; PartNumber: 59S2AQ-40MT5-H; Design Note: Footprint in library is a generic example - only application specific footprint delivers High Performance; DatasheetVersion: c00; PackageVersion: c00; PackageReference: 59S2AQ-40MT5-H; PackageDescription: FaKrA Right Angle Plug, Pin in Paste, 22.65 x 8.5 x 3.8 mm; Coding: H (Violet); Mounting Technology: Pin-in-Paste; ComponentLink1Description: Manufacturer URL; ComponentLink1URL: http://www.rosenberger.de; ComponentLink2Description: Datasheet; ComponentLink2URL: http://rosenberger.de/ok/images/documents/db/59S2AQ-40MT5-Y.pdf; ComponentLink3Description: Package Specification; ComponentLink3URL: http://rosenberger.de/ok/images/documents/db/59S2AQ-40MT5-Y.pdf; ComponentLink4Description: Series Overview / Design Note; ComponentLink4URL: http://rosenberger.de/ok/images/documents/spez/59fakra.pdf; ComponentLink5Description: Webshop / RFQ; ComponentLink5URL: http://www.rosenberger.com/en/contact/sales/
footprint ROS-59S2AQ-40MT5-H_V (FaKrA Right Angle Plug, Pin in Paste, 22.65x8.5x3.8mm, Rosenberger Recommended)
pins: 1, MH

## 59S2AQ-40MT5-I
designator P?
FaKrA Right Angle Plug, Edge Mount Pin in Paste, Coding I (Beige), In Line, Up to 6 GHz, -40 to 105 degC; PartNumber: 59S2AQ-40MT5-I; Design Note: Footprint in library is a generic example - only application specific footprint delivers High Performance; DatasheetVersion: c00; PackageVersion: c00; PackageReference: 59S2AQ-40MT5-I; PackageDescription: FaKrA Right Angle Plug, Pin in Paste, 22.65 x 8.5 x 3.8 mm; Coding: I (Beige); Mounting Technology: Pin-in-Paste; ComponentLink1Description: Manufacturer URL; ComponentLink1URL: http://www.rosenberger.de; ComponentLink2Description: Datasheet; ComponentLink2URL: http://rosenberger.de/ok/images/documents/db/59S2AQ-40MT5-Y.pdf; ComponentLink3Description: Package Specification; ComponentLink3URL: http://rosenberger.de/ok/images/documents/db/59S2AQ-40MT5-Y.pdf; ComponentLink4Description: Series Overview / Design Note; ComponentLink4URL: http://rosenberger.de/ok/images/documents/spez/59fakra.pdf; ComponentLink5Description: Webshop / RFQ; ComponentLink5URL: http://www.rosenberger.com/en/contact/sales/
footprint ROS-59S2AQ-40MT5-I_V (FaKrA Right Angle Plug, Pin in Paste, 22.65x8.5x3.8mm, Rosenberger Recommended)
pins: 1, MH

## 59S2AQ-40MT5-K
designator P?
FaKrA Right Angle Plug, Edge Mount Pin in Paste, Coding K (Curry), In Line, Up to 6 GHz, -40 to 105 degC; PartNumber: 59S2AQ-40MT5-K; Design Note: Footprint in library is a generic example - only application specific footprint delivers High Performance; DatasheetVersion: c00; PackageVersion: c00; PackageReference: 59S2AQ-40MT5-K; PackageDescription: FaKrA Right Angle Plug, Pin in Paste, 22.65 x 8.5 x 3.8 mm; Coding: K (Curry); Mounting Technology: Pin-in-Paste; ComponentLink1Description: Manufacturer URL; ComponentLink1URL: http://www.rosenberger.de; ComponentLink2Description: Datasheet; ComponentLink2URL: http://rosenberger.de/ok/images/documents/db/59S2AQ-40MT5-Y.pdf; ComponentLink3Description: Package Specification; ComponentLink3URL: http://rosenberger.de/ok/images/documents/db/59S2AQ-40MT5-Y.pdf; ComponentLink4Description: Series Overview / Design Note; ComponentLink4URL: http://rosenberger.de/ok/images/documents/spez/59fakra.pdf; ComponentLink5Description: Webshop / RFQ; ComponentLink5URL: http://www.rosenberger.com/en/contact/sales/
footprint ROS-59S2AQ-40MT5-K_V (FaKrA Right Angle Plug, Pin in Paste, 22.65x8.5x3.8mm, Rosenberger Recommended)
pins: 1, MH
